# Altium footprint library ACTION_Connector.PcbLib: 116 footprints (part 8 of 8)
Each footprint in its own frame and in the unit in brackets; x right, y up, seen from the top. Pads: shape width x height; smd on the part's side, far side on the other; paste and mask are expansions set on the pad; w line width, h text height; cw(c..) or ccw(c..) is an arc to the next point about the centre after c.
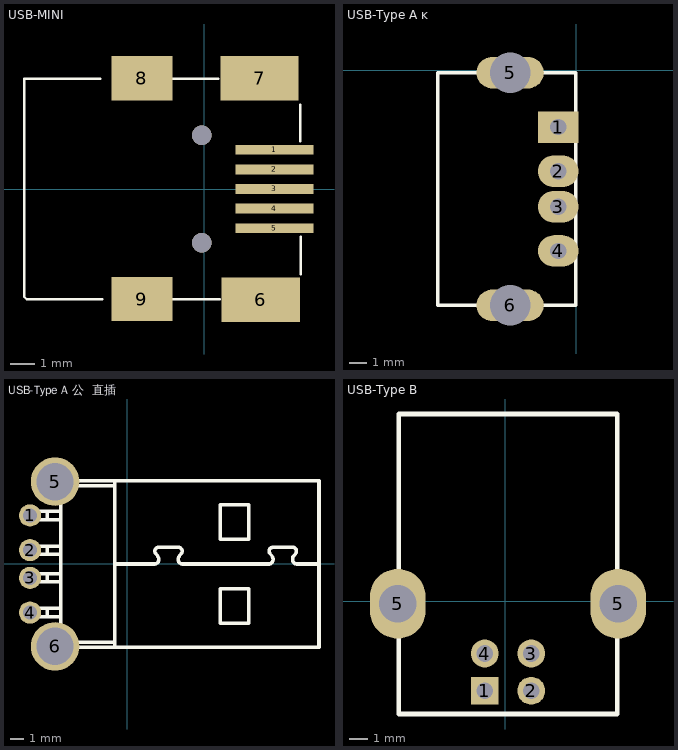
[diagram p7: the footprints below, top view; thin cyan lines are the x and y axes]

## USB-MINI [mm]
pads (9):
  rect 3.2x0.4 smd: 1(2.871,1.6) 2(2.871,0.8) 3(2.871,0) 4(2.871,-0.8) 5(2.871,-1.6)
  rect 3.2x1.8 smd: 6(2.311,-4.521) 7(2.26,4.521)
  rect 2.5x1.8 smd: 8(-2.54,4.521) 9(-2.54,-4.496)
via -0.104,-2.2 diameter 0.8 hole 0.8
via -0.104,2.2 diameter 0.8 hole 0.8
Top Overlay:
  lines w0.1: -4.839,4.5 -7.339,4.5 -7.339,-4.4 -7.239,-4.5 -4.739,-4.5
  lines w0.102: -4.839,4.5 -4.246,4.5 ; -4.739,-4.5 -4.169,-4.5 -4.165,-4.496 ; -1.6,-4.496 0.636,-4.496 ; -1.574,4.496 0.585,4.496 ; 3.912,1.956 3.912,3.429 ; 3.938,-3.48 3.938,-1.956
3D body "USB_mini_B.STEP": height 3.95, standoff -1, extent -5.976,-5.299 3.224,5.401

## USB-Type A ĸ [mil]
pads (6):
  rect 90x70 hole 36: 1(-40,-126)
  oval 90x70 hole 36: 2(-40,-224.43) 3(-40,-303.17) 4(-40,-401.59)
  oval 149.61x70 hole 90.55: 5(-146.69,-5.13) 6(-146.69,-522.46)
Top Overlay:
  lines w8: -308,-522.46 -0.63,-522.46 -0.63,-5.13 -308,-5.13 -308,-522.46
3D body "USB-A DIP.STEP": height 273.62, standoff -165.35, extent -538.68,-575 0.68,47.05

## USB-Type A 公  直插 [mm]
pads (6):
  round 1.6 hole 1: 1(-7.01,3.505) 2(-7.01,1.003) 3(-7.01,-1.003) 4(-7.01,-3.505)
  round 3.5 hole 2.7: 5(-5.21,5.946) 6(-5.21,-5.946)
Top Overlay:
  lines w0.254: -5.766,-3.81 -5.766,-3.2 ; -5.766,-1.295 -5.766,-0.711 ; -5.766,0.711 -5.766,1.295 ; -4.798,-6.426 -4.798,-5.994 ; -4.798,6.426 -4.798,5.994 ; 1.981,0 -0.914,0 ; 1.991,-0.01 ccw(c1.935,0.329) 2.217,0.526 ; 2.032,0.787 2.212,0.533 ; 2.037,0.79 cw(c2.25,0.939) 2.25,1.199 ; 2.235,1.219 3.711,1.219 ; 3.711,1.199 cw(c3.708,0.939) 3.922,0.79 ; 3.736,0.533 3.912,0.787 ; 3.744,0.526 ccw(c4.026,0.329) 3.97,-0.01 ; 3.965,0 10.236,0 ; 10.241,-0.01 ccw(c10.185,0.329) 10.467,0.526 ; 10.287,0.787 10.467,0.533 ; 10.287,0.79 cw(c10.5,0.939) 10.5,1.199 ; 10.49,1.219 11.938,1.219 ; 11.961,1.199 cw(c11.958,0.939) 12.172,0.79 ; 11.966,0.533 11.991,0.533 12.167,0.787 ; 11.994,0.526 ccw(c12.276,0.329) 12.22,-0.01 ; 12.22,0 13.843,0 ; -5.766,3.2 -5.766,3.81 ; -5.766,3.2 -7.01,3.2 -7.01,3.81 -5.766,3.81 ; -5.766,3.2 -4.798,3.2 ; -5.766,3.81 -4.798,3.81 ; -4.798,-5.994 -2.819,-5.994 -0.914,-5.994 ; -4.798,-5.994 -4.798,-5.639 ; -4.798,-5.639 -0.914,-5.639 ; -4.798,-5.639 -4.798,-3.81 ; -4.798,-3.81 -7.01,-3.81 -7.01,-3.2 -4.798,-3.2 ; -4.798,-3.81 -4.798,-3.2 ; -4.798,-3.2 -4.798,-1.295 ; -4.798,-1.295 -7.01,-1.295 -7.01,-0.711 -4.798,-0.711 ; -4.798,-1.295 -4.798,-0.711 ; -4.798,-0.711 -4.798,0.711 ; -4.798,0.711 -7.01,0.711 -7.01,1.295 -4.798,1.295 ; -4.798,0.711 -4.798,1.295 ; -4.798,1.295 -4.798,3.2 ; -4.798,3.2 -4.798,3.81 ; -4.798,3.81 -4.798,5.639 ; -4.798,5.639 -2.819,5.639 -0.914,5.639 ; -4.798,5.639 -4.798,5.994 ; -4.798,5.994 -2.819,5.994 -0.914,5.994 ; -0.914,-5.994 -0.914,-5.639 ; -0.914,-5.994 13.843,-5.994 13.843,0 ; -0.914,-5.639 -0.914,0 ; -0.914,0 -0.914,5.639 ; -0.914,5.639 -0.914,5.994 ; -0.914,5.994 13.843,5.994 13.843,0 ; 6.706,-4.267 6.706,-1.778 8.763,-1.778 8.763,-4.267 6.706,-4.267 ; 6.706,1.778 6.706,4.267 8.763,4.267 8.763,1.778 6.706,1.778
3D body "usb_a-usb_a-lp-c.stp": height 4.5, standoff -1.3, extent -7.087,-6.405 12.838,6.201

## USB-Type B [mil]
pads (6):
  rect 60x60 hole 36: 1(-44,-192)
  round 60 hole 36: 2(56,-192) 3(56,-112) 4(-44,-112)
  oval 120x150 hole 80: 5(-231,-5) 5(243,-5)
Top Overlay:
  lines w10: -229,-242 -229,-2 -229,403 241,403 241,273 241,-2 241,-242 -229,-242
3D body "USB_B.STEP": height 393.7, standoff -182.79, extent -280.27,-247 302.27,402.61